# Altium footprint library PcbLib.PcbLib: 141 footprints (part 4 of 9)
Each footprint in its own frame and in the unit in brackets; x right, y up, seen from the top. Pads: shape width x height; smd on the part's side, far side on the other; paste and mask are expansions set on the pad; w line width, h text height; cw(c..) or ccw(c..) is an arc to the next point about the centre after c.
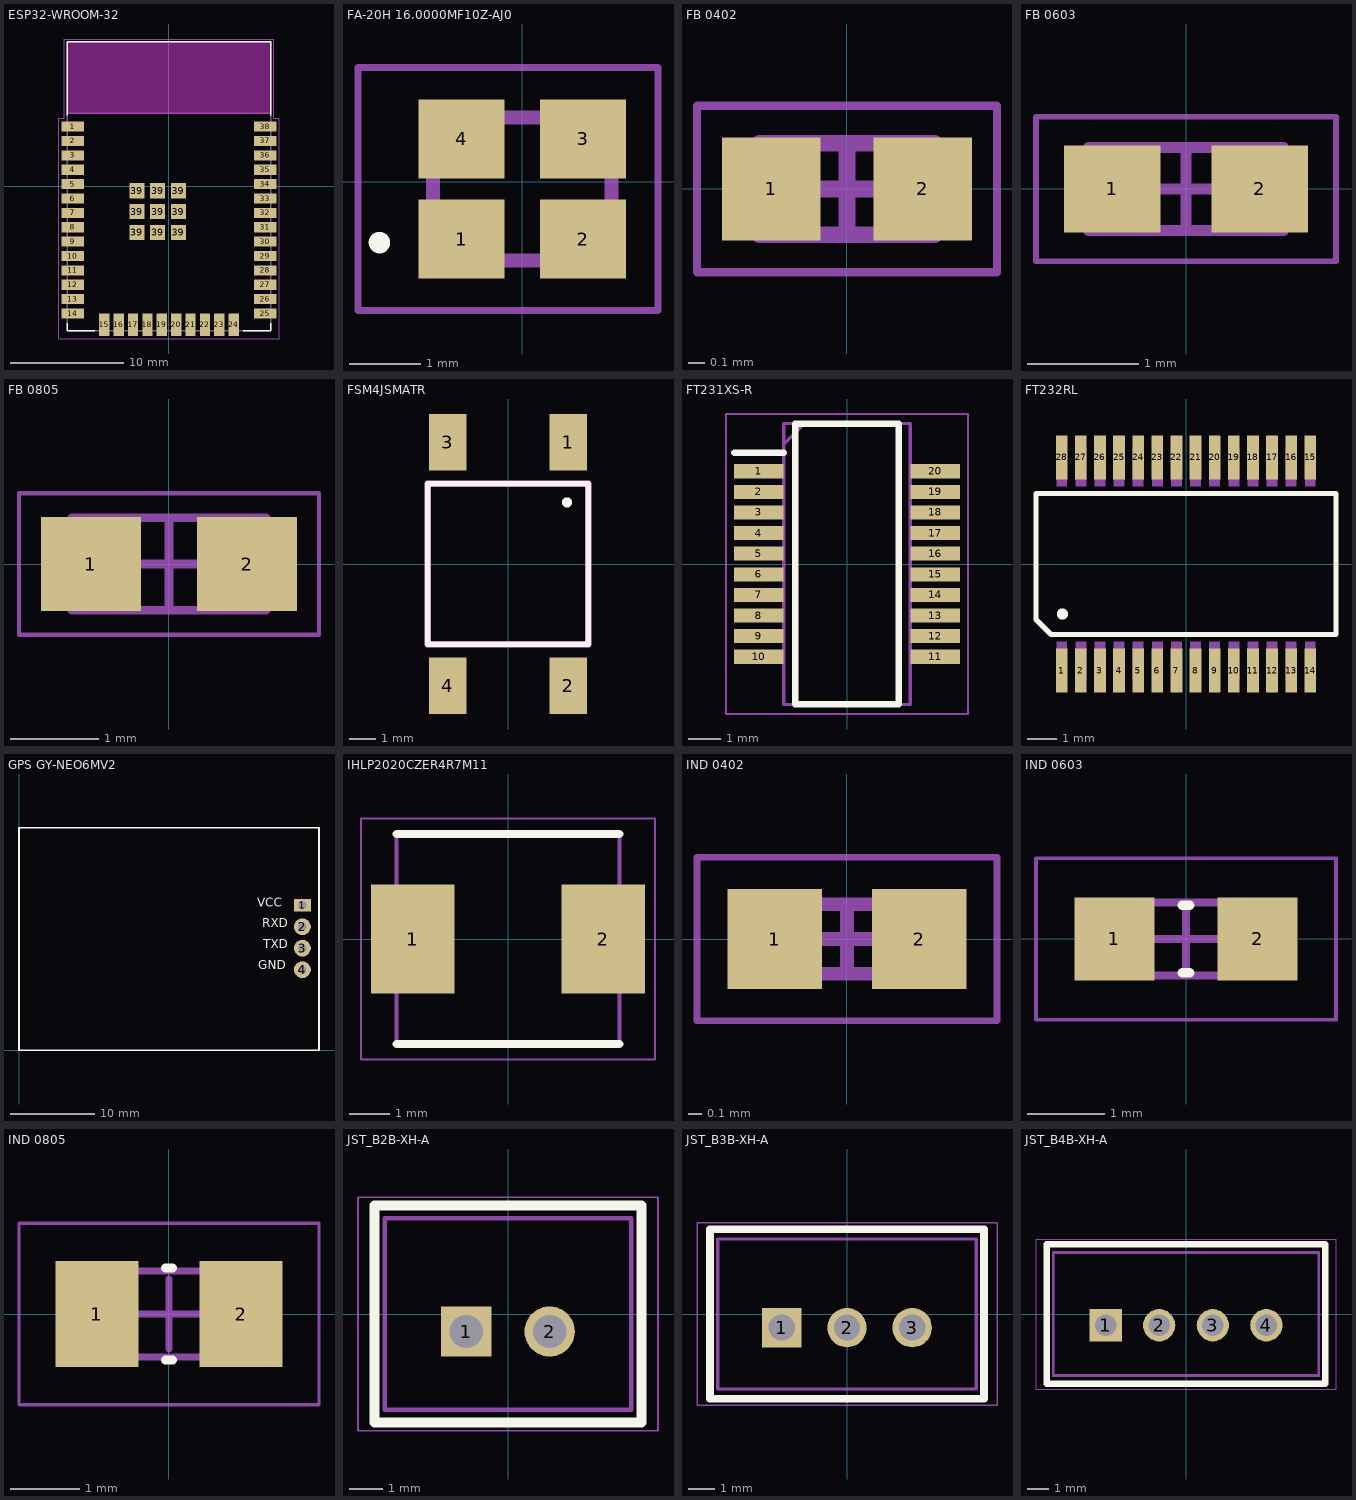
[diagram p3: the footprints below, top view; thin cyan lines are the x and y axes]

## ESP32-WROOM-32 [mm]
pads (47):
  rect 2x0.9 smd: 1(-8.5,5.26) 2(-8.5,3.99) 3(-8.5,2.72) 4(-8.5,1.45) 5(-8.5,0.18) 6(-8.5,-1.09) 7(-8.5,-2.36) 8(-8.5,-3.63) 9(-8.5,-4.9) 10(-8.5,-6.17) 11(-8.5,-7.44) 12(-8.5,-8.71) 13(-8.5,-9.98) 14(-8.5,-11.25) 25(8.5,-11.25) 26(8.5,-9.98) 27(8.5,-8.71) 28(8.5,-7.44) 29(8.5,-6.17) 30(8.5,-4.9) 31(8.5,-3.63) 32(8.5,-2.36) 33(8.5,-1.09) 34(8.5,0.18) 35(8.5,1.45) 36(8.5,2.72) 37(8.5,3.99) 38(8.5,5.26)
  rect 0.9x2 smd: 15(-5.715,-12.25) 16(-4.445,-12.25) 17(-3.175,-12.25) 18(-1.905,-12.25) 19(-0.635,-12.25) 20(0.635,-12.25) 21(1.905,-12.25) 22(3.175,-12.25) 23(4.445,-12.25) 24(5.715,-12.25)
  rect 1.33x1.33 smd: 39(-2.835,-4.075) 39(-2.835,-2.24) 39(-2.835,-0.405) 39(-1,-4.075) 39(-1,-2.24) 39(-1,-0.405) 39(0.835,-4.075) 39(0.835,-2.24) 39(0.835,-0.405)
Top Overlay:
  lines w0.127: -9,-12.1 -9,-12.75 -6.55,-12.75 ; -9,6.25 -9,12.75 9,12.75 9,6.25 ; 6.55,-12.75 9,-12.75 9,-12.1
Keep-Out Layer:
  region: 9,6.45 -9,6.45 -9,12.75 9,12.75
  region: 9,6.45 -9,6.45 -9,12.75 9,12.75
Mechanical 13:
  lines w0.127: -9,6.45 9,6.45 ; -9,6.45 -9,12.75 9,12.75 9,6.45 ; -9,6.45 -9,-12.75 9,-12.75 9,6.45
  text "ANTENNA" at -6,9 h1.78
Mechanical 15:
  lines w0.05: -9.75,-13.5 -9.75,6 -9.25,6 -9.25,13 9.25,13 9.25,6 9.75,6 9.75,-13.5 -9.75,-13.5
3D body "step_temp.STEP": height 3.2, standoff 0, extent -9,-12.65 9,12.85

## FA-20H 16.0000MF10Z-AJ0 [mm]
pads (4):
  rect 1.2x1.1 smd: 1(-0.85,-0.8) 2(0.85,-0.8) 3(0.85,0.6) 4(-0.85,0.6)
Top Overlay:
  lines w0.2: -2,-0.9 ccw(c-2,-0.85) -2,-0.8 ccw(c-2,-0.85) -2,-0.9
Mechanical 13:
  lines w0.2: -1.25,-1.1 -1.25,0.9 1.25,0.9 1.25,-1.1 -1.25,-1.1
Mechanical 15:
  lines w0.1: -2.3,-1.8 1.9,-1.8 1.9,1.6 -2.3,1.6 -2.3,-1.8
3D body "FA-20H_16.0000MF10Z-AJ0.stp": height 0.63, standoff 0, extent -1.25,-1.1 1.25,0.9

## FB 0402 [mm]
height 0.55
pads (2):
  rect 0.59x0.62 smd: 1(-0.455,0) 2(0.455,0)
Top Courtyard:
  lines w0.05: -0.9,-0.5 -0.9,0.5 0.9,0.5 0.9,-0.5 -0.9,-0.5
  lines w0.1: -0.275,0 0.275,0 ; 0,-0.275 0,0.275
Top Assembly:
  lines w0.1: -0.525,-0.275 -0.525,0.275 0.525,0.275 0.525,-0.275 -0.525,-0.275
3D body "FB 0402.step": height 0.55, standoff 0, extent -0.525,-0.275 0.525,0.275

## FB 0603 [mm]
height 0.8
pads (2):
  rect 0.87x0.78 smd: 1(-0.665,0) 2(0.665,0)
Top Courtyard:
  lines w0.05: -1.35,-0.65 -1.35,0.65 1.35,0.65 1.35,-0.65 -1.35,-0.65
  lines w0.1: -0.375,0 0.375,0 ; 0,-0.375 0,0.375
Top Assembly:
  lines w0.1: -0.875,-0.375 -0.875,0.375 0.875,0.375 0.875,-0.375 -0.875,-0.375
3D body "FB 0603.step": height 0.8, standoff 0, extent -0.875,-0.375 0.875,0.375

## FB 0805 [mm]
height 1.25
pads (2):
  rect 1.13x1.07 smd: 1(-0.885,0) 2(0.885,0)
Top Courtyard:
  lines w0.05: -1.7,-0.8 1.7,-0.8 1.7,0.8 -1.7,0.8 -1.7,-0.8
  lines w0.1: -0.5,0 0.5,0 ; 0,-0.5 0,0.5
Top Assembly:
  lines w0.1: -1.1,-0.525 1.1,-0.525 1.1,0.525 -1.1,0.525 -1.1,-0.525
3D body "FB 0805.step": height 1.25, standoff 0, extent -1.1,-0.525 1.1,0.525

## FSM4JSMATR [mm]
pads (4):
  rect 1.4x2.1 smd: 1(2.25,4.55) 2(2.25,-4.55) 3(-2.25,4.55) 4(-2.25,-4.55)
Top Overlay:
  circle w0.2: c2.2,2.3 r0.09
  lines w0.2: -3,-3 -3,3 3,3 3,-3 -3,-3
Mechanical 13:
  lines w0.254: -3,-3 -3,3 3,3 3,-3 -3,-3
3D body "FSM4JSMATR.stp": height 5.13, standoff 0, extent -3,-5 3,5

## FT231XS-R [mm]
pads (20):
  rect 1.526x0.435 smd: 1(-2.712,2.858) 2(-2.712,2.222) 3(-2.712,1.588) 4(-2.712,0.952) 5(-2.712,0.318) 6(-2.712,-0.318) 7(-2.712,-0.952) 8(-2.712,-1.588) 9(-2.712,-2.222) 10(-2.712,-2.858) 11(2.712,-2.858) 12(2.712,-2.222) 13(2.712,-1.588) 14(2.712,-0.952) 15(2.712,-0.318) 16(2.712,0.318) 17(2.712,0.952) 18(2.712,1.588) 19(2.712,2.222) 20(2.712,2.858)
Top Overlay:
  lines w0.2: -3.475,3.425 -1.95,3.425 ; -1.6,-4.324 -1.6,4.324 1.6,4.324 1.6,-4.324 -1.6,-4.324
Mechanical 15:
  lines w0.1: -1.95,3.69 -1.314,4.324 ; -1.95,-4.324 -1.95,4.324 1.95,4.324 1.95,-4.324 -1.95,-4.324
Mechanical 20:
  lines w0.05: -3.725,-4.619 -3.725,4.619 3.725,4.619 3.725,-4.619 -3.725,-4.619
3D body "FT231XS-R.stp": height 1.75, standoff 0, extent -2.997,-4.324 2.997,4.324

## FT232RL [mm]
pads (28):
  rect 0.4x1.5 smd: 1(-4.225,-3.625) 2(-3.575,-3.625) 3(-2.925,-3.625) 4(-2.275,-3.625) 5(-1.625,-3.625) 6(-0.975,-3.625) 7(-0.325,-3.625) 8(0.325,-3.625) 9(0.975,-3.625) 10(1.625,-3.625) 11(2.275,-3.625) 12(2.925,-3.625) 13(3.575,-3.625) 14(4.225,-3.625) 15(4.225,3.625) 16(3.575,3.625) 17(2.925,3.625) 18(2.275,3.625) 19(1.625,3.625) 20(0.975,3.625) 21(0.325,3.625) 22(-0.325,3.625) 23(-0.975,3.625) 24(-1.625,3.625) 25(-2.275,3.625) 26(-2.925,3.625) 27(-3.575,3.625) 28(-4.225,3.625)
Top Overlay:
  circle w0.2: c-4.2,-1.7 r0.09
  lines w0.175: -5.1,-1.89 -5.1,2.4 5.1,2.4 5.1,-2.4 -4.59,-2.4 -5.1,-1.89
Mechanical 13:
  region: -4.047,-3.937 -4.403,-3.937 -4.403,-2.642 -4.047,-2.642
  region: -3.397,-3.937 -3.753,-3.937 -3.753,-2.642 -3.397,-2.642
  region: -2.747,-3.937 -3.103,-3.937 -3.103,-2.642 -2.747,-2.642
  region: -2.097,-3.937 -2.453,-3.937 -2.453,-2.642 -2.097,-2.642
  region: -1.447,-3.937 -1.803,-3.937 -1.803,-2.642 -1.447,-2.642
  region: -0.797,-3.937 -1.153,-3.937 -1.153,-2.642 -0.797,-2.642
  region: -0.147,-3.937 -0.503,-3.937 -0.503,-2.642 -0.147,-2.642
  region: 0.503,-3.937 0.147,-3.937 0.147,-2.642 0.503,-2.642
  region: 1.153,-3.937 0.797,-3.937 0.797,-2.642 1.153,-2.642
  region: 1.803,-3.937 1.447,-3.937 1.447,-2.642 1.803,-2.642
  region: 2.453,-3.937 2.097,-3.937 2.097,-2.642 2.453,-2.642
  region: 3.103,-3.937 2.747,-3.937 2.747,-2.642 3.103,-2.642
  region: 3.753,-3.937 3.397,-3.937 3.397,-2.642 3.753,-2.642
  region: 4.403,-3.937 4.047,-3.937 4.047,-2.642 4.403,-2.642
  region: 4.403,2.642 4.047,2.642 4.047,3.937 4.403,3.937
  region: 3.753,2.642 3.397,2.642 3.397,3.937 3.753,3.937
  region: 3.103,2.642 2.747,2.642 2.747,3.937 3.103,3.937
  region: 2.453,2.642 2.097,2.642 2.097,3.937 2.453,3.937
  region: 1.803,2.642 1.447,2.642 1.447,3.937 1.803,3.937
  region: 1.153,2.642 0.797,2.642 0.797,3.937 1.153,3.937
  region: 0.503,2.642 0.147,2.642 0.147,3.937 0.503,3.937
  region: -0.147,2.642 -0.503,2.642 -0.503,3.937 -0.147,3.937
  region: -0.797,2.642 -1.153,2.642 -1.153,3.937 -0.797,3.937
  region: -1.447,2.642 -1.803,2.642 -1.803,3.937 -1.447,3.937
  region: -2.097,2.642 -2.453,2.642 -2.453,3.937 -2.097,3.937
  region: -2.747,2.642 -3.103,2.642 -3.103,3.937 -2.747,3.937
  region: -3.397,2.642 -3.753,2.642 -3.753,3.937 -3.397,3.937
  region: -4.047,2.642 -4.403,2.642 -4.403,3.937 -4.047,3.937
3D body "step_temp.STEP": height 2, standoff 0, extent -5.1,-3.9 5.1,3.9

## GPS GY-NEO6MV2 [mm]
pads (4):
  rect 2x1.5 hole 1: 1(33.533,17.145)
  round 2 hole 1: 2(33.533,14.605) 3(33.533,12.065) 4(33.533,9.525)
Top Overlay:
  lines w0.2: 0,0 0.001,26.3 35.5,26.3 35.5,0 0,0
  text "GND" at 28.3,9.2 h1.8
  text "VCC" at 28.2,16.6 h1.8
  text "TXD" at 28.9,11.7 h1.8
  text "RXD" at 28.8,14.2 h1.8
3D body "GY-GPS6MV2 v1.step": height 6.41, standoff -3.59, extent 0.056,0.031 35.456,26.231

## IHLP2020CZER4R7M11 [mm]
pads (2):
  rect 2.05x2.7 smd: 1(-2.35,0) 2(2.35,0)
Top Overlay:
  lines w0.2: -2.745,-2.59 2.745,-2.59 ; -2.745,2.59 2.745,2.59
Mechanical 15:
  lines w0.1: -2.745,-2.59 2.745,-2.59 2.745,2.59 -2.745,2.59 -2.745,-2.59
Mechanical 20:
  lines w0.05: -3.625,-2.967 3.625,-2.967 3.625,2.967 -3.625,2.967 -3.625,-2.967
3D body "IHLP2020CZER4R7M11.stp": height 2.87, standoff 0.01, extent -2.725,-2.646 2.725,2.5

## IND 0402 [mm]
height 0.51
pads (2):
  rect 0.69x0.73 smd: 1(-0.53,0) 2(0.53,0)
Top Courtyard:
  lines w0.05: -1.1,-0.6 1.1,-0.6 1.1,0.6 -1.1,0.6 -1.1,-0.6
  lines w0.1: -0.255,0 0.255,0 ; 0,-0.255 0,0.255
Top Assembly:
  lines w0.1: -0.505,-0.255 0.505,-0.255 0.505,0.255 -0.505,0.255 -0.505,-0.255
3D body: height 0.51, standoff 0, extent 0.255,-0.255 0.505,0.255
3D body: height 0.51, standoff 0, extent -0.505,-0.255 -0.255,0.255
3D body: height 0.51, standoff 0, extent -0.255,-0.255 0.255,0.255

## IND 0603 [mm]
height 1.35
pads (2):
  rect 1.04x1.08 smd: 1(-0.93,0) 2(0.93,0)
Top Overlay:
  lines w0.127: -0.05,-0.44 0.05,-0.44 ; -0.05,0.44 0.05,0.44
Top Courtyard:
  lines w0.05: -1.95,-1.05 1.95,-1.05 1.95,1.05 -1.95,1.05 -1.95,-1.05
  lines w0.1: -0.475,0 0.475,0 ; 0,-0.475 0,0.475
Top Assembly:
  lines w0.1: -0.875,-0.475 0.875,-0.475 0.875,0.475 -0.875,0.475 -0.875,-0.475
3D body: height 1.35, standoff 0, extent 0.625,-0.475 0.875,0.475
3D body: height 1.35, standoff 0, extent -0.875,-0.475 -0.625,0.475
3D body: height 1.35, standoff 0, extent -0.625,-0.475 0.625,0.475

## IND 0805 [mm]
height 0.87
pads (2):
  rect 1.19x1.52 smd: 1(-1.035,0) 2(1.035,0)
Top Overlay:
  lines w0.127: -0.05,-0.66 0.05,-0.66 ; -0.05,0.66 0.05,0.66
Top Courtyard:
  lines w0.05: -2.15,-1.3 2.15,-1.3 2.15,1.3 -2.15,1.3 -2.15,-1.3
  lines w0.1: -0.5,0 0.5,0 ; 0,-0.5 0,0.5
Top Assembly:
  lines w0.1: -1.02,-0.615 1.02,-0.615 1.02,0.615 -1.02,0.615 -1.02,-0.615
3D body: height 0.87, standoff 0, extent 0.52,-0.615 1.02,0.615
3D body: height 0.87, standoff 0, extent -1.02,-0.615 -0.52,0.615
3D body: height 0.87, standoff 0, extent -0.52,-0.615 0.52,0.615

## JST_B2B-XH-A [mm]
pads (2):
  rect 1.508x1.508 hole 1: 1(-1.25,-0.525)
  round 1.508 hole 1: 2(1.25,-0.525)
Top Overlay:
  lines w0.3: -4,-3.25 4,-3.25 4,3.25 -4,3.25 -4,-3.25
Mechanical 13:
  lines w0.127: -3.7,-2.875 3.7,-2.875 3.7,2.875 -3.7,2.875 -3.7,-2.875
Mechanical 15:
  lines w0.05: -4.5,-3.5 -4.5,3.5 4.5,3.5 4.5,-3.5 -4.5,-3.5
3D body "B2B-XH-A-LF.STEP": height 7, standoff -3.4, extent -3.7,-2.875 3.7,2.875

## JST_B3B-XH-A [mm]
pads (3):
  rect 1.508x1.508 / inner round 1.508 / far side rect 1.508x1.508 hole 1: 1(-2.5,-0.525)
  round 1.508 hole 1: 2(0,-0.525) 3(2.5,-0.525)
Top Overlay:
  lines w0.3: -5.25,-3.25 5.25,-3.25 5.25,3.25 -5.25,3.25 -5.25,-3.25
Mechanical 13:
  lines w0.127: -4.95,-2.875 -4.95,2.875 4.95,2.875 4.95,-2.875 -4.95,-2.875
Mechanical 15:
  lines w0.05: -5.75,-3.5 -5.75,3.5 5.75,3.5 5.75,-3.5 -5.75,-3.5
3D body "step_temp.STEP": height 7, standoff -3.4, extent -4.95,-2.875 4.95,2.875

## JST_B4B-XH-A [mm]
height 7
pads (4):
  rect 1.508x1.508 / inner round 1.508 / far side rect 1.508x1.508 hole 1: 1(-3.75,-0.525)
  round 1.508 hole 1: 2(-1.25,-0.525) 3(1.25,-0.525) 4(3.75,-0.525)
Top Overlay:
  lines w0.3: -6.5,-3.25 -6.5,3.25 6.5,3.25 6.5,-3.25 -6.5,-3.25
Mechanical 13:
  lines w0.127: -6.2,-2.875 -6.2,2.875 6.2,2.875 6.2,-2.875 -6.2,-2.875
Mechanical 15:
  lines w0.05: -7,-3.5 7,-3.5 7,3.5 -7,3.5 -7,-3.5
3D body "B4B-XH-A-LF.STEP": height 7, standoff -3.4, extent -6.2,-2.875 6.2,2.875